# Altium footprint library lib_protel_HC.PCBLIB: 724 footprints (part 32 of 46)
Each footprint in its own frame and in the unit in brackets; x right, y up, seen from the top. Pads: shape width x height; smd on the part's side, far side on the other; paste and mask are expansions set on the pad; w line width, h text height; cw(c..) or ccw(c..) is an arc to the next point about the centre after c.
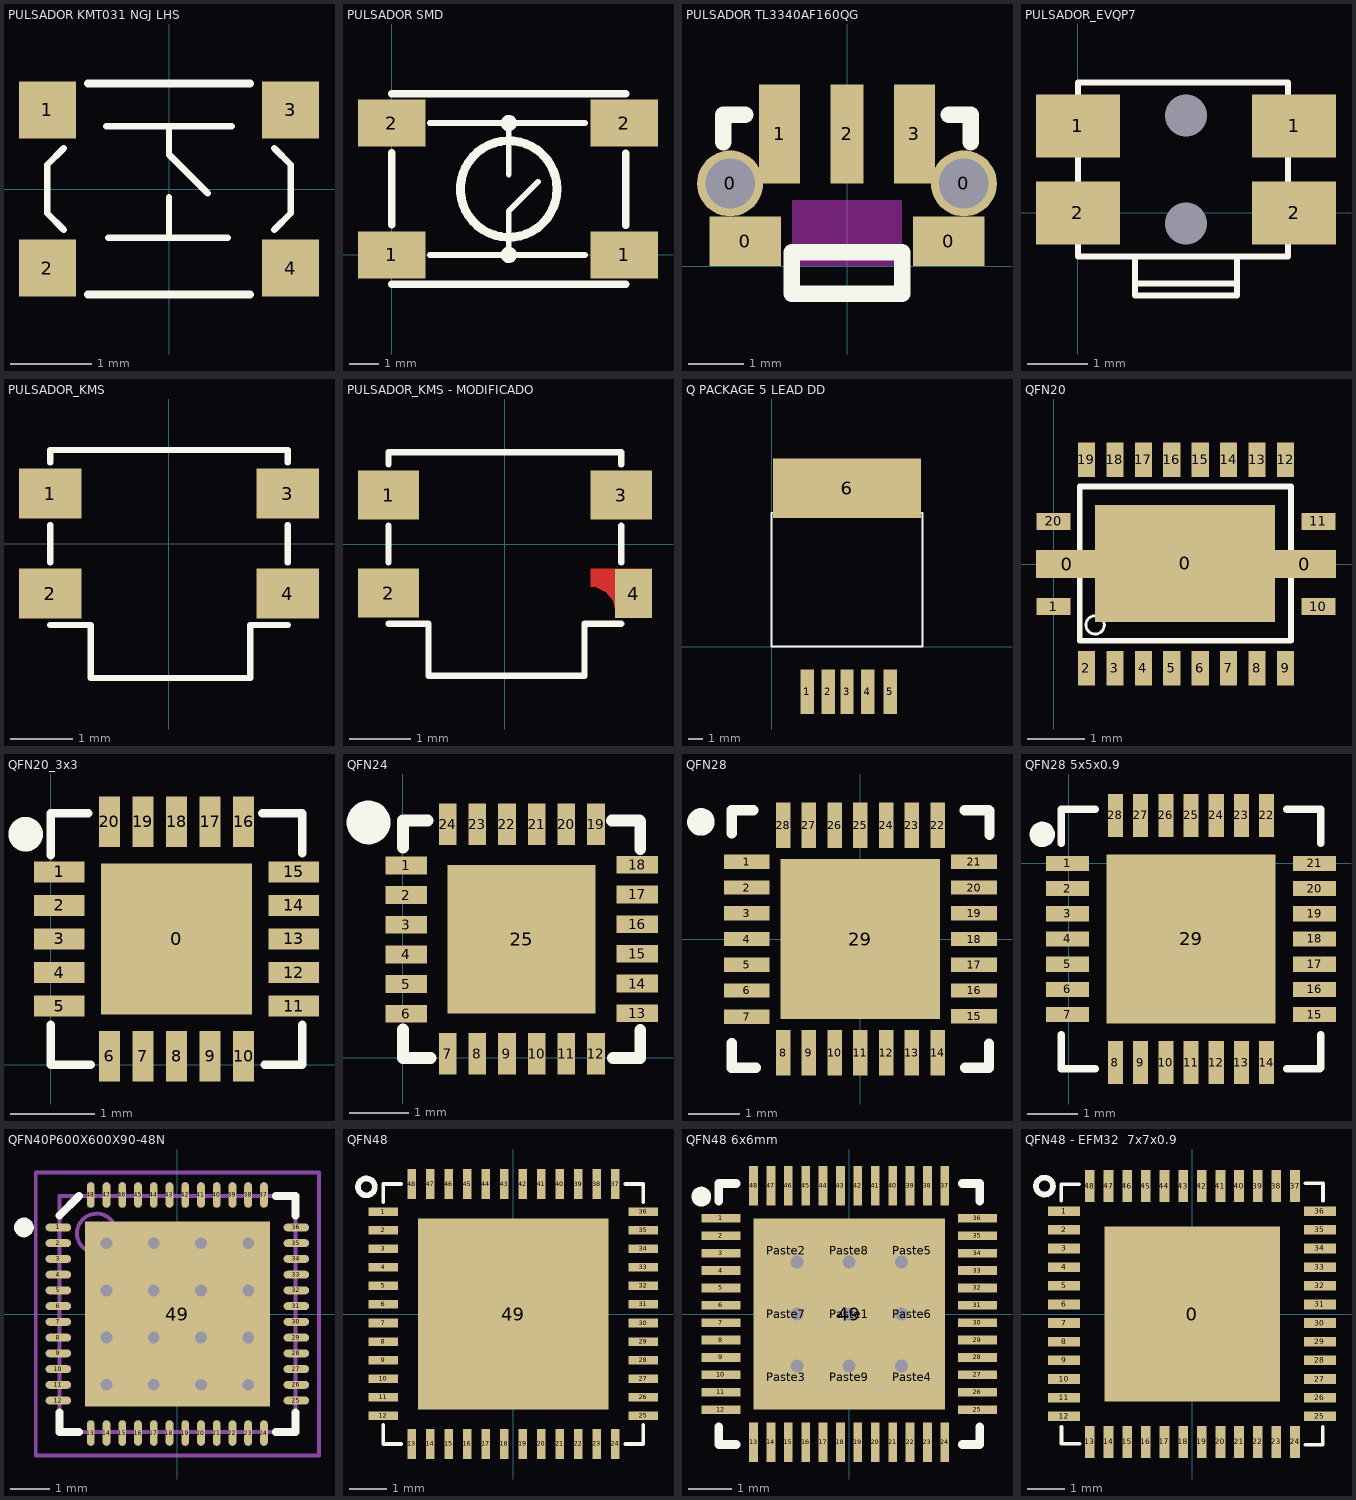
[diagram p31: the footprints below, top view; thin cyan lines are the x and y axes]

## PULSADOR KMT031 NGJ LHS [mm] "Switch táctil 3,4x2,6"
height 0.65
pads (4):
  rect 0.7x0.7 smd: 1(-1.5,0.975) 2(-1.5,-0.975) 3(1.5,0.975) 4(1.5,-0.975)
Top Overlay:
  lines w0.08: -1.3,-0.5 -1.5,-0.3 -1.5,0.3 -1.3,0.5 ; -0.775,0.775 0.775,0.775 ; -0.75,-0.6 0,-0.6 ; 0,-0.1 0,-0.6 ; 0,0.775 0,0.425 0.475,-0.05 ; 0.725,-0.6 0,-0.6 ; 1.3,-0.5 1.5,-0.3 1.5,0.3 1.3,0.5
  lines w0.1: -1,-1.3 1,-1.3 ; -1,1.3 1,1.3
3D body "Ensamblaje2 - copia.STEP": height 0.6, standoff 0, extent -1.741,-1.3 1.775,1.3

## PULSADOR SMD [mm]
pads (4):
  rect 2.3x1.6 smd: 1(0,0) 1(7.95,0) 2(0,4.5) 2(7.95,4.5)
Top Overlay:
  circle w0.3: c4,2.25 r1.65
  circle w0.254: c4,4.5 r0.15
  circle w0.254: c4,0 r0.15
  lines w0.2: 1.3,0 6.6,0 ; 1.3,4.5 6.6,4.5 ; 4,0 4,1.5 5,2.5 ; 4,2.75 4,4.5
  lines w0.25: 0,-1 8,-1 ; 0,1.025 0,3.5 ; 0,5.5 8,5.5 ; 8,1 8,3.475

## PULSADOR TL3340AF160QG [mm] "Pulsador ángulo recto 3pin"
height 3.3
pads (7):
  round 1.2 hole 0.9: 0(-2.125,1.5) 0(2.125,1.5)
  rect 1.3x0.9 smd: 0(-1.85,0.45) 0(1.85,0.45)
  rect 0.75x1.8 smd: 1(-1.225,2.4) 3(1.225,2.4)
  rect 0.6x1.8 smd: 2(0,2.4)
Top Overlay:
  lines w0.3: -2.25,2.25 -2.25,2.75 -1.85,2.75 ; 1.85,2.75 2.25,2.75 2.25,2.25 ; -1,-0.5 1,-0.5 1,0.25 -1,0.25 -1,-0.5
Keep-Out Layer:
  rectangle: -1,0 1,1.2
3D body "TL3340AF160QG.stp": height 3.17, standoff -0.58, extent -2.25,-0.583 2.25,3.083

## PULSADOR_EVQP7 [mm] "PULSADOR PANASONIC"
height 1.35
pads (6):
  round 0 hole 0.7: 0(1.8,-0.175) 0(1.8,1.625)
  rect 1.4x1.05 smd: 1(0,1.45) 1(3.6,1.45) 2(0,0) 2(3.6,0)
Top Overlay:
  lines w0.1: 0.95,-1.175 2.65,-1.175 ; 0.95,-0.725 0.95,-1.375 2.65,-1.375 2.65,-0.725 ; 0,-0.725 0,2.175 3.5,2.175 3.5,-0.725 0,-0.725

## PULSADOR_KMS [mm] "4 PAD LATERAL MICROSWITCH"
height 1.42
pads (4):
  rect 1x0.8 smd: 1(-1.9,0.8) 2(-1.9,-0.8) 3(1.9,0.8) 4(1.9,-0.8)
Top Overlay:
  lines w0.1: -1.9,-1.3 -1.25,-1.3 -1.25,-2.15 1.3,-2.15 1.3,-1.3 1.9,-1.3 ; -1.9,-0.3 -1.9,0.3 ; -1.9,1.3 -1.9,1.5 1.9,1.5 1.9,1.3 ; 1.9,-0.3 1.9,0.3
3D body "User Library-KMS231G.STEP": height 1.42, standoff -0.02, extent -2.3,-2.15 2.3,1.4

## PULSADOR_KMS - MODIFICADO [mm] "4 PAD LATERAL MICROSWITCH"
height 1.42
pads (4):
  rect 1x0.8 smd: 1(-1.9,0.8) 2(-1.9,-0.8) 3(1.9,0.8)
  rect 0.6x0.8 smd: 4(2.1,-0.808)
Top Layer:
  region: 1.8,-1.2 1.812,-1.108 1.773,-0.929 1.658,-0.786 1.492,-0.708 1.4,-0.7 1.4,-0.4 2.4,-0.4 2.4,-1.2
Top Overlay:
  lines w0.1: -1.9,-1.3 -1.25,-1.3 -1.25,-2.15 1.3,-2.15 1.3,-1.3 1.9,-1.3 ; -1.9,-0.3 -1.9,0.3 ; -1.9,1.3 -1.9,1.5 1.9,1.5 1.9,1.3 ; 1.9,-0.3 1.9,0.3
3D body "User Library-KMS231G.STEP": height 1.42, standoff -0.02, extent -2.3,-2.15 2.3,1.4

## Q PACKAGE 5 LEAD DD [mm] "FOOTPRINT PARA LT1528"
height 4.5
pads (6):
  rect 0.9x3 smd: 1(2.413,-3.048) 2(3.81,-3.048) 3(5.08,-3.048) 4(6.477,-3.048) 5(8.001,-3.048)
  rect 10x4 smd: 6(5.08,10.668)
Top Overlay:
  lines w0.127: 0,0 10.16,0 10.16,9.017 0,9.017 0,0

## QFN20 [mm] "encapsulado para TPS75003"
height 1
pads (23):
  rect 1.1x0.5 smd mask+0: 0(0.24,0) 0(4.41,0)
  rect 3.16x2.06 smd mask+0: 0(2.31,0.01)
  rect 0.6x0.3 smd: 1(0,-0.75) 10(4.65,-0.75) 11(4.65,0.75) 20(0,0.75)
  rect 0.3x0.6 smd: 2(0.575,-1.83) 3(1.075,-1.83) 4(1.575,-1.83) 5(2.075,-1.83) 6(2.575,-1.83) 7(3.075,-1.83) 8(3.575,-1.83) 9(4.075,-1.83) 12(4.075,1.83) 13(3.575,1.83) 14(3.075,1.83) 15(2.575,1.83) 16(2.075,1.83) 17(1.575,1.83) 18(1.075,1.83) 19(0.575,1.83)
Top Overlay:
  circle w0.051: c0.729,-1.07 r0.161
  lines w0.1: 0.46,-1.35 4.17,-1.35 4.17,1.36 0.46,1.36 0.46,-1.35

## QFN20_3x3 [mm] "SGTL5000"
height 0.6
pads (21):
  rect 1.8x1.8 smd mask+0.05: 0(1.5,1.5)
  rect 0.6x0.25 smd mask+0.05: 1(0.1,2.3) 2(0.1,1.9) 3(0.1,1.5) 4(0.1,1.1) 5(0.1,0.7) 11(2.9,0.7) 12(2.9,1.1) 13(2.9,1.5) 14(2.9,1.9) 15(2.9,2.3)
  rect 0.25x0.6 smd mask+0.05: 6(0.7,0.1) 7(1.1,0.1) 8(1.5,0.1) 9(1.9,0.1) 10(2.3,0.1) 16(2.3,2.9) 17(1.9,2.9) 18(1.5,2.9) 19(1.1,2.9) 20(0.7,2.9)
Top Overlay:
  circle w0.254: c-0.3,2.75 r0.079
  lines w0.1: 0,0.475 0,0 0.475,0 ; 0,2.5 0,3 0.45,3 ; 2.525,3 3,3 3,2.525 ; 2.55,0 3,0 3,0.475

## QFN24 [mm] "encapsulado para LTC3455"
height 0.75
pads (25):
  rect 0.7x0.3 smd: 1(0.06,3.245) 2(0.06,2.745) 3(0.06,2.245) 4(0.06,1.745) 5(0.06,1.245) 6(0.06,0.745) 13(3.95,0.755) 14(3.95,1.255) 15(3.95,1.755) 16(3.95,2.255) 17(3.95,2.755) 18(3.95,3.255)
  rect 0.3x0.7 smd: 7(0.755,0.07) 8(1.255,0.07) 9(1.755,0.07) 10(2.255,0.07) 11(2.755,0.07) 12(3.255,0.07) 19(3.255,3.94) 20(2.755,3.94) 21(2.255,3.94) 22(1.755,3.94) 23(1.255,3.94) 24(0.755,3.94)
  rect 2.5x2.5 smd mask+0: 25(2,2)
Top Overlay:
  circle w0.381: c-0.578,3.97 r0.178
  lines w0.2: 0,0.48 0,0 0.47,0 ; 0,3.55 0,4 0.42,4 ; 3.52,4 3.99,4 4,3.99 4,3.52 ; 3.54,0 4,0 4,0.47

## QFN28 [mm] "QFN28"
height 0.85
pads (29):
  rect 0.89x0.28 smd: 1(-2.21,1.5) 2(-2.21,1) 3(-2.21,0.5) 4(-2.21,0) 5(-2.21,-0.5) 6(-2.21,-1) 7(-2.21,-1.51) 15(2.21,-1.5) 16(2.21,-1) 17(2.21,-0.5) 18(2.21,0) 19(2.21,0.5) 20(2.21,1) 21(2.21,1.5)
  rect 0.28x0.89 smd: 8(-1.5,-2.21) 9(-1,-2.21) 10(-0.5,-2.21) 11(0,-2.21) 12(0.5,-2.21) 13(1,-2.21) 14(1.5,-2.21) 22(1.5,2.21) 23(1,2.21) 24(0.5,2.21) 25(0,2.21) 26(-0.5,2.21) 27(-1,2.21) 28(-1.5,2.21)
  rect 3.1x3.1 smd mask+0: 29(0,0)
Top Overlay:
  circle w0.381: c-3.098,2.275 r0.077
  lines w0.2: -2.5,-2.02 -2.5,-2.5 -2.03,-2.5 ; -2.5,2.05 -2.5,2.5 -2.08,2.5 ; 2.03,2.5 2.5,2.5 2.51,2.49 2.51,2.02 ; 2.04,-2.5 2.5,-2.5 2.5,-2.03

## QFN28 5x5x0.9 [mm] "Encapsulado para MGC3130"
height 0.9
pads (29):
  rect 0.85x0.3 smd paste+0 mask+0.075: 1(-0.025,0)
  rect 0.85x0.3 smd mask+0.075: 2(-0.025,-0.5) 3(-0.025,-1) 4(-0.025,-1.5) 5(-0.025,-2) 6(-0.025,-2.5) 7(-0.025,-3) 15(4.875,-3) 16(4.875,-2.5) 17(4.875,-2) 18(4.875,-1.5) 19(4.875,-1) 20(4.875,-0.5) 21(4.875,0)
  rect 0.3x0.85 smd paste+0 mask+0.075: 8(0.925,-3.95)
  rect 0.3x0.85 smd mask+0.075: 9(1.425,-3.95) 10(1.925,-3.95) 11(2.425,-3.95) 12(2.925,-3.95) 13(3.425,-3.95) 14(3.925,-3.95) 22(3.925,0.95) 23(3.425,0.95) 24(2.925,0.95) 25(2.425,0.95) 26(1.925,0.95) 27(1.425,0.95) 28(0.925,0.95)
  rect 3.35x3.35 smd mask+0.075: 29(2.425,-1.5)
Top Overlay:
  circle w0.254: c-0.525,0.575 r0.125
  lines w0.15: -0.15,-3.4 -0.15,-4.075 0.525,-4.075 ; -0.15,0.4 -0.15,1.075 0.525,1.075 ; 4.325,-4.075 4.975,-4.075 5,-4.05 5,-3.4 ; 4.325,1.075 5,1.075 5,0.4
3D body "User Library-QFN28-0_5.STEP": height 1, standoff 0, extent -0.075,-4 4.925,1

## QFN40P600X600X90-48N [mm]
height 0.9
pads (49):
  oval 0.65x0.2 smd: 1(-3.025,2.2) 2(-3.025,1.8) 3(-3.025,1.4) 4(-3.025,1) 5(-3.025,0.6) 6(-3.025,0.2) 7(-3.025,-0.2) 8(-3.025,-0.6) 9(-3.025,-1) 10(-3.025,-1.4) 11(-3.025,-1.8) 12(-3.025,-2.2) 25(3.025,-2.2) 26(3.025,-1.8) 27(3.025,-1.4) 28(3.025,-1) 29(3.025,-0.6) 30(3.025,-0.2) 31(3.025,0.2) 32(3.025,0.6) 33(3.025,1) 34(3.025,1.4) 35(3.025,1.8) 36(3.025,2.2)
  oval 0.2x0.65 smd: 13(-2.2,-3.025) 14(-1.8,-3.025) 15(-1.4,-3.025) 16(-1,-3.025) 17(-0.6,-3.025) 18(-0.2,-3.025) 19(0.2,-3.025) 20(0.6,-3.025) 21(1,-3.025) 22(1.4,-3.025) 23(1.8,-3.025) 24(2.2,-3.025) 37(2.2,3.025) 38(1.8,3.025) 39(1.4,3.025) 40(1,3.025) 41(0.6,3.025) 42(0.2,3.025) 43(-0.2,3.025) 44(-0.6,3.025) 45(-1,3.025) 46(-1.4,3.025) 47(-1.8,3.025) 48(-2.2,3.025)
  rect 4.7x4.7 smd: 49(0,0)
via 1.8,-1.8 diameter 0.7 hole 0.3
via 0.6,-1.8 diameter 0.7 hole 0.3
via -0.6,-1.8 diameter 0.7 hole 0.3
via -1.8,-1.8 diameter 0.7 hole 0.3
via 1.8,-0.6 diameter 0.7 hole 0.3
via 0.6,-0.6 diameter 0.7 hole 0.3
via -0.6,-0.6 diameter 0.7 hole 0.3
via -1.8,-0.6 diameter 0.7 hole 0.3
via 1.8,0.6 diameter 0.7 hole 0.3
via 0.6,0.6 diameter 0.7 hole 0.3
via -0.6,0.6 diameter 0.7 hole 0.3
via -1.8,0.6 diameter 0.7 hole 0.3
via 1.8,1.8 diameter 0.7 hole 0.3
via 0.6,1.8 diameter 0.7 hole 0.3
via -0.6,1.8 diameter 0.7 hole 0.3
via -1.8,1.8 diameter 0.7 hole 0.3
Top Overlay:
  circle w0.25: c-3.9,2.2 r0.125
  lines w0.2: -3,-2.5 -3,-3 -2.5,-3 ; -3,2.5 -2.5,3 ; 2.5,-3 3,-3 3,-2.5 ; 2.5,3 3,3 3,2.5
Mechanical 13:
  circle w0.1: c-2.05,2.05 r0.5
  lines w0.1: -3,-3 3,-3 3,3 -3,3 -3,-3
Mechanical 15:
  lines w0.1: -0.5,0 0.5,0 ; 0,-0.5 0,0.5 ; -3.6,-3.6 3.6,-3.6 3.6,3.6 -3.6,3.6 -3.6,-3.6
3D body: height 0.9, standoff 0, extent -3,-3 3,3

## QFN48 [mm] "encapsulado para BQ500211"
height 1
pads (49):
  rect 0.8x0.23 smd: 1(-3.505,2.757) 2(-3.505,2.257) 3(-3.505,1.757) 4(-3.505,1.257) 5(-3.505,0.757) 6(-3.505,0.257) 7(-3.505,-0.243) 8(-3.505,-0.743) 9(-3.505,-1.243) 10(-3.505,-1.743) 11(-3.505,-2.243) 12(-3.505,-2.743) 25(3.505,-2.743) 26(3.505,-2.243) 27(3.505,-1.743) 28(3.505,-1.243) 29(3.505,-0.743) 30(3.505,-0.243) 31(3.505,0.257) 32(3.505,0.757) 33(3.505,1.257) 34(3.505,1.757) 35(3.505,2.257) 36(3.505,2.757)
  rect 0.23x0.8 smd: 13(-2.743,-3.505) 14(-2.243,-3.505) 15(-1.743,-3.505) 16(-1.243,-3.505) 17(-0.743,-3.505) 18(-0.243,-3.505) 19(0.257,-3.505) 20(0.757,-3.505) 21(1.257,-3.505) 22(1.757,-3.505) 23(2.257,-3.505) 24(2.757,-3.505) 37(2.757,3.505) 38(2.257,3.505) 39(1.757,3.505) 40(1.257,3.505) 41(0.757,3.505) 42(0.257,3.505) 43(-0.243,3.505) 44(-0.743,3.505) 45(-1.243,3.505) 46(-1.743,3.505) 47(-2.243,3.505) 48(-2.743,3.505)
  rect 5.15x5.15 smd: 49(0,0)
Top Overlay:
  circle w0.152: c-3.961,3.429 r0.227
  lines w0.1: -3.505,-2.997 -3.505,-3.505 -3.022,-3.505 ; -3.505,3.023 -3.505,3.505 -3.022,3.505 ; 3.023,-3.505 3.505,-3.505 3.505,-2.997 ; 3.023,3.505 3.505,3.505 3.505,3.023

## QFN48 6x6mm [mm]
pads (58):
  rect 0.9x0.2 smd mask+0.05: 1(-2.95,2.2) 2(-2.95,1.8) 3(-2.95,1.4) 4(-2.95,1) 5(-2.95,0.6) 6(-2.95,0.2) 7(-2.95,-0.2) 8(-2.95,-0.6) 9(-2.95,-1) 10(-2.95,-1.4) 11(-2.95,-1.8) 12(-2.95,-2.2) 25(2.95,-2.2) 26(2.95,-1.8) 27(2.95,-1.4) 28(2.95,-1) 29(2.95,-0.6) 30(2.95,-0.2) 31(2.95,0.2) 32(2.95,0.6) 33(2.95,1) 34(2.95,1.4) 35(2.95,1.8) 36(2.95,2.2)
  rect 0.2x0.9 smd mask+0.05: 13(-2.2,-2.95) 14(-1.8,-2.95) 15(-1.4,-2.95) 16(-1,-2.95) 17(-0.6,-2.95) 18(-0.2,-2.95) 19(0.2,-2.95) 20(0.6,-2.95) 21(1,-2.95) 22(1.4,-2.95) 23(1.8,-2.95) 24(2.2,-2.95) 37(2.2,2.95) 38(1.8,2.95) 39(1.4,2.95) 40(1,2.95) 41(0.6,2.95) 42(0.2,2.95) 43(-0.2,2.95) 44(-0.6,2.95) 45(-1,2.95) 46(-1.4,2.95) 47(-1.8,2.95) 48(-2.2,2.95)
  rect 4.4x4.4 smd paste-4.4 mask+0.05: 49(0,0)
  rect 1.3x1.3 on Top Paste mask+0.05: Paste1(0,0) Paste2(-1.45,1.45) Paste3(-1.45,-1.45) Paste4(1.45,-1.45) Paste5(1.45,1.45) Paste6(1.45,0) Paste7(-1.45,0) Paste8(0,1.45) Paste9(0,-1.45)
via 1.2,1.2 diameter 0.6 hole 0.3
via -1.2,1.2 diameter 0.6 hole 0.3
via 1.2,-1.2 diameter 0.6 hole 0.3
via 0,-1.2 diameter 0.6 hole 0.3
via -1.2,-1.2 diameter 0.6 hole 0.3
via -1.2,0 diameter 0.6 hole 0.3
via 1.2,0 diameter 0.6 hole 0.3
via 0,0 diameter 0.6 hole 0.3
via 0,1.2 diameter 0.6 hole 0.3
Top Overlay:
  circle w0.254: c-3.4,2.7 r0.1
  lines w0.2: -3,-2.6 -3,-3 -2.6,-3 ; -3,2.6 -3,3 -2.6,3 ; 2.6,-3 3,-3 3,-2.6 ; 2.6,3 3,3 3,2.6
3D body: height 1, standoff 0, extent -3,-3 3,3

## QFN48 - EFM32  7x7x0.9 [mm] "EFM32"
height 0.9
pads (49):
  rect 4.7x4.7 smd: 0(0,0)
  rect 0.86x0.26 smd: 1(-3.435,2.757) 2(-3.435,2.257) 3(-3.435,1.757) 4(-3.435,1.257) 5(-3.435,0.757) 6(-3.435,0.257) 7(-3.435,-0.243) 8(-3.435,-0.743) 9(-3.435,-1.243) 10(-3.435,-1.743) 11(-3.435,-2.243) 12(-3.435,-2.743) 25(3.425,-2.743) 26(3.425,-2.243) 27(3.425,-1.743) 28(3.425,-1.243) 29(3.425,-0.743) 30(3.425,-0.243) 31(3.425,0.257) 32(3.425,0.757) 33(3.425,1.257) 34(3.425,1.757) 35(3.425,2.257) 36(3.425,2.757)
  rect 0.26x0.86 smd: 13(-2.743,-3.43) 14(-2.243,-3.43) 15(-1.743,-3.43) 16(-1.243,-3.43) 17(-0.743,-3.43) 18(-0.243,-3.43) 19(0.257,-3.43) 20(0.757,-3.43) 21(1.257,-3.43) 22(1.757,-3.43) 23(2.257,-3.43) 24(2.757,-3.43) 37(2.757,3.43) 38(2.257,3.43) 39(1.757,3.43) 40(1.257,3.43) 41(0.757,3.43) 42(0.257,3.43) 43(-0.243,3.43) 44(-0.743,3.43) 45(-1.243,3.43) 46(-1.743,3.43) 47(-2.243,3.43) 48(-2.743,3.43)
Top Overlay:
  circle w0.152: c-3.961,3.429 r0.227
  lines w0.1: -3.51,3.04 -3.51,3.48 -3.025,3.48 ; -3.505,-3.025 -3.505,-3.48 -3.022,-3.48 ; 3.037,-3.505 3.498,-3.505 3.498,-3.025 ; 3.04,3.505 3.508,3.505 3.508,3.04
3D body "QFN-48-1EP_7x7mm_P0.5mm.step": height 0.77, standoff 0, extent -3.5,-3.5 3.5,3.5